# Altium footprint library LimeMicroAltiumLib_pcbLib_r05.PcbLib: 746 footprints (part 17 of 48)
Each footprint in its own frame and in the unit in brackets; x right, y up, seen from the top. Pads: shape width x height; smd on the part's side, far side on the other; paste and mask are expansions set on the pad; w line width, h text height; cw(c..) or ccw(c..) is an arc to the next point about the centre after c.
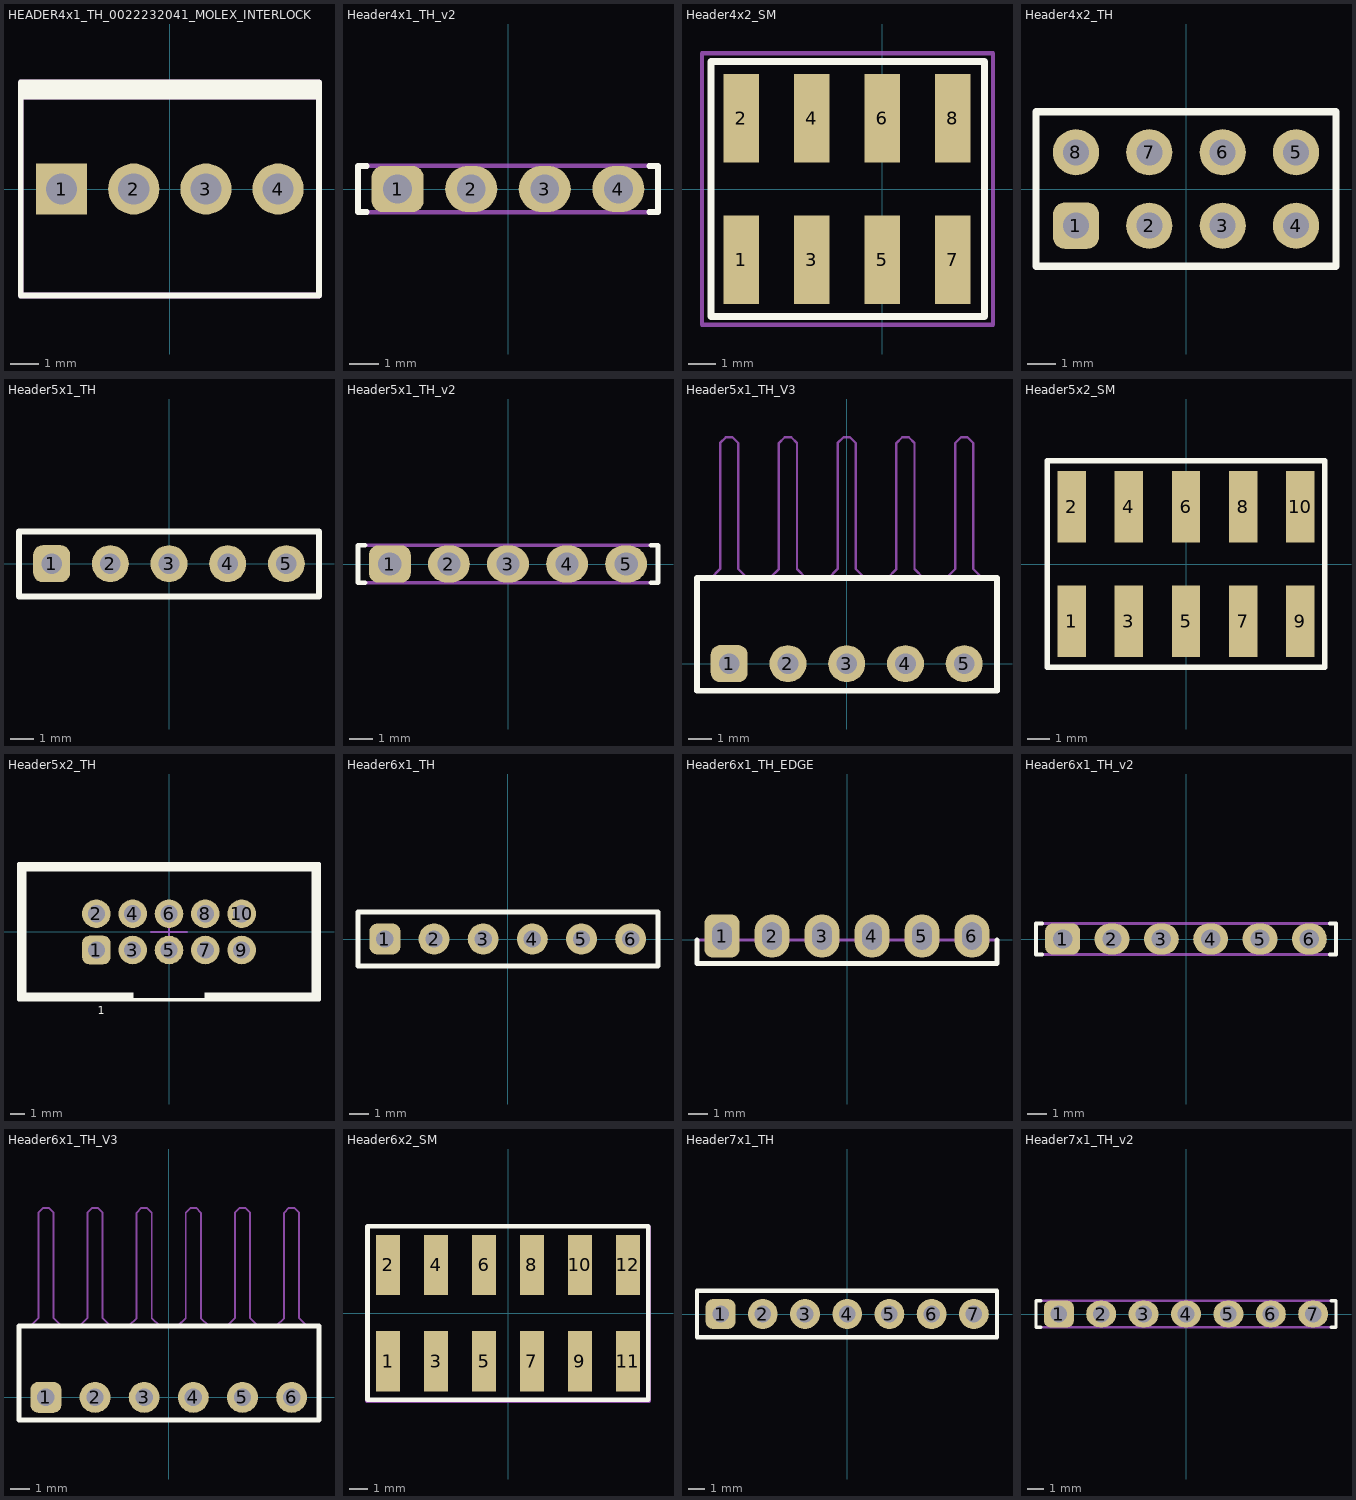
[diagram p16: the footprints below, top view; thin cyan lines are the x and y axes]

## HEADER4x1_TH_0022232041_MOLEX_INTERLOCK [mm]
pads (4):
  rect 1.8x1.8 hole 1.1: 1(-3.81,0)
  round 1.8 hole 1.1: 2(-1.27,0) 3(1.27,0) 4(3.81,0)
Top Overlay:
  region: -5.31,3.25 -5.31,3.75 5.19,3.75 5.19,3.25
  lines w0.2: -5.25,3.25 5.25,3.25 ; -5.25,-3.75 5.25,-3.75 5.25,3.75 -5.25,3.75 -5.25,-3.75
Mechanical 15:
  region: -5.25,3.25 -5.25,3.75 5.25,3.75 5.25,3.25
  lines w0.2: -5.25,3.25 5.19,3.25 ; -5.25,-3.75 5.25,-3.75 5.25,3.75 -5.25,3.75 -5.25,-3.75
  text "Interlock wall" at -3.75,2.25 h0.55
  text ".Designator" at 0,0 h0.55
3D body "022232041.stp": height 10.68, standoff -3.54, extent -5.004,-3.251 5.004,3.099

## Header4x1_TH_v2 [mm]
pads (4):
  rrect50% 1.8x1.6 hole 1: 1(-3.814,0)
  oval 1.8x1.6 hole 1: 2(-1.271,0) 3(1.271,0) 4(3.814,0)
Top Overlay:
  lines w0.2: -4.886,-0.8 -5.186,-0.8 -5.186,0.8 -4.886,0.8 ; 4.886,-0.8 5.186,-0.8 5.186,0.8 4.886,0.8
Mechanical 15:
  lines w0.15: -5.186,-0.8 -5.186,0.8 5.186,0.8 5.186,-0.8 -5.186,-0.8
  text ".Designator" at -0.025,0 h0.55

## Header4x2_SM [mm]
pads (8):
  rect 1.27x3.2 smd: 1(-5.086,-2.55) 2(-5.086,2.55) 3(-2.543,-2.55) 4(-2.543,2.55) 5(0,-2.55) 6(0,2.55) 7(2.543,-2.55) 8(2.543,2.55)
Top Overlay:
  lines w0.254: -6.186,-4.6 3.7,-4.6 3.7,4.6 -6.186,4.6 -6.186,-4.6
Mechanical 15:
  lines w0.15: -6.5,-4.9 4,-4.9 4,4.9 -6.5,4.9 -6.5,-4.9
  text ".Designator" at -1.4,-0.1 h0.55
3D body "pin_header_a-sl254-dg-g08mp1.stp": height 9.7, standoff -0.04, extent -6.38,-3.75 3.78,3.75

## Header4x2_TH [mm]
pads (8):
  rrect50% 1.6x1.6 hole 0.9: 1(-3.814,-1.271)
  round 1.6 hole 0.9: 2(-1.271,-1.271) 3(1.271,-1.271) 4(3.814,-1.271) 5(3.814,1.271) 6(1.271,1.271) 7(-1.271,1.271) 8(-3.814,1.271)
Top Overlay:
  lines w0.254: -5.2,-2.675 -5.2,2.675 5.2,2.675 5.2,-2.675 -5.2,-2.675
Mechanical 15:
  lines w0.15: -5.2,-2.675 5.2,-2.675 5.2,2.675 -5.2,2.675 -5.2,-2.675
  text ".Designator" at 0,0 h0.55
3D body "65775.stp": height 8.54, standoff -3, extent -5.084,-2.541 -2.544,-0.001
3D body "65775.stp": height 8.54, standoff -3, extent -2.541,-2.541 -0.001,-0.001
3D body "65775.stp": height 8.54, standoff -3, extent 0.001,-2.541 2.541,-0.001
3D body "65775.stp": height 8.54, standoff -3, extent 2.544,-2.541 5.084,-0.001
3D body "65775.stp": height 8.54, standoff -3, extent 2.544,0.002 5.084,2.542
3D body "65775.stp": height 8.54, standoff -3, extent 0.001,0.002 2.541,2.542
3D body "65775.stp": height 8.54, standoff -3, extent -2.541,0.002 -0.001,2.542
3D body "65775.stp": height 8.54, standoff -3, extent -5.084,0.002 -2.544,2.542

## Header5x1_TH [mm]
pads (5):
  rrect50% 1.6x1.6 hole 0.9: 1(-5.086,0)
  round 1.6 hole 0.9: 2(-2.543,0) 3(0,0) 4(2.543,0) 5(5.086,0)
Top Overlay:
  lines w0.254: -6.5,-1.425 -6.5,1.4 6.5,1.4 6.5,-1.425 -6.5,-1.425
Mechanical 15:
  lines w0.15: -6.5,-1.425 6.5,-1.425 6.5,1.4 -6.5,1.4 -6.5,-1.425
  text ".Designator" at 0,0 h0.55
3D body "65775.stp": height 8.54, standoff -3, extent -6.356,-1.27 -3.816,1.27
3D body "65775.stp": height 8.54, standoff -3, extent -3.813,-1.27 -1.273,1.27
3D body "65775.stp": height 8.54, standoff -3, extent -1.27,-1.27 1.27,1.27
3D body "65775.stp": height 8.54, standoff -3, extent 1.273,-1.27 3.813,1.27
3D body "65775.stp": height 8.54, standoff -3, extent 3.816,-1.27 6.356,1.27

## Header5x1_TH_v2 [mm]
pads (5):
  rrect50% 1.8x1.6 hole 1: 1(-5.086,0)
  oval 1.8x1.6 hole 1: 2(-2.543,0) 3(0,0) 4(2.543,0) 5(5.086,0)
Top Overlay:
  lines w0.2: -6.157,-0.8 -6.457,-0.8 -6.457,0.8 -6.157,0.8 ; 6.157,-0.8 6.457,-0.8 6.457,0.8 6.157,0.8
Mechanical 15:
  lines w0.15: -6.457,-0.8 6.457,-0.8 6.457,0.8 -6.457,0.8 -6.457,-0.8
  text ".Designator" at 0,0 h0.55

## Header5x1_TH_V3 [mm]
pads (5):
  rrect50% 1.6x1.6 hole 0.9: 1(-5.086,0)
  round 1.6 hole 0.9: 2(-2.543,0) 3(0,0) 4(2.543,0) 5(5.086,0)
Top Overlay:
  lines w0.254: -6.479,-1.175 -6.479,3.7 6.504,3.7 6.504,-1.175 -6.479,-1.175
Mechanical 15:
  lines w0.1: -5.879,3.7 -5.479,4.1 -5.479,9.55 -5.229,9.8 -4.943,9.8 -4.693,9.55 -4.693,4.1 -4.293,3.7 ; -3.336,3.7 -2.936,4.1 -2.936,9.55 -2.686,9.8 -2.4,9.8 -2.15,9.55 -2.15,4.1 -1.75,3.7 ; -0.793,3.7 -0.393,4.1 -0.393,9.55 -0.143,9.8 0.143,9.8 0.393,9.55 0.393,4.1 0.793,3.7 ; 1.75,3.7 2.15,4.1 2.15,9.55 2.4,9.8 2.686,9.8 2.936,9.55 2.936,4.1 3.336,3.7 ; 4.293,3.7 4.693,4.1 4.693,9.55 4.943,9.8 5.229,9.8 5.479,9.55 5.479,4.1 5.879,3.7
  lines w0.15: -6.479,-1.175 6.504,-1.175 6.504,3.7 -6.479,3.7 -6.479,-1.175
  text ".Designator" at 0,0 h0.55
3D body "User Library-Header_Male_RA_Low_1Pin.STEP": height 2.51, standoff -3, extent -6.356,-0.32 -3.816,9.81
3D body "User Library-Header_Male_RA_Low_1Pin.STEP": height 2.51, standoff -3, extent -3.813,-0.32 -1.273,9.81
3D body "User Library-Header_Male_RA_Low_1Pin.STEP": height 2.51, standoff -3, extent -1.27,-0.32 1.27,9.81
3D body "User Library-Header_Male_RA_Low_1Pin.STEP": height 2.51, standoff -3, extent 1.273,-0.32 3.813,9.81
3D body "User Library-Header_Male_RA_Low_1Pin.STEP": height 2.51, standoff -3, extent 3.816,-0.32 6.356,9.81

## Header5x2_SM [mm]
pads (10):
  rect 1.27x3.2 smd: 1(-5.086,-2.55) 2(-5.086,2.55) 3(-2.543,-2.55) 4(-2.543,2.55) 5(0,-2.55) 6(0,2.55) 7(2.543,-2.55) 8(2.543,2.55) 9(5.086,-2.55) 10(5.086,2.55)
Top Overlay:
  lines w0.254: -6.186,-4.6 6.189,-4.6 6.189,4.6 -6.186,4.6 -6.186,-4.6
Mechanical 15:
  lines w0.15: -6.2,-4.6 -6.2,4.6 6.2,4.6 6.2,-4.6 -6.2,-4.6
  text ".Designator" at 0,0 h0.55
3D body "pin_header_a-sl254-dg-g10mp1.stp": height 9.7, standoff -0.04, extent -6.35,-3.75 6.35,3.75

## Header5x2_TH [mm]
pads (10):
  rrect50% 2x2 hole 1.2: 1(-5.086,-1.271)
  round 2 hole 1.2: 2(-5.086,1.271) 3(-2.543,-1.271) 4(-2.543,1.271) 5(0,-1.271) 6(0,1.271) 7(2.543,-1.271) 8(2.543,1.271) 9(5.086,-1.271) 10(5.086,1.271)
Top Overlay:
  region: -10.5,-4.75 -10.5,4.75 -10,4.75 -10,-4.75
  region: -10.25,-4.25 -2.5,-4.25 -2.5,-4.75 -10.25,-4.75
  region: 10.25,-4.25 2.5,-4.25 2.5,-4.75 10.25,-4.75
  region: 10.5,-4.75 10.5,4.75 10,4.75 10,-4.75
  region: 10.5,4.25 -10.5,4.25 -10.5,4.75 10.5,4.75
  lines w0.254: -10.5,-4.75 10.5,-4.75 10.5,4.75 -10.5,4.75 -10.5,-4.75
  text "1" at -5,-5.75 h0.55
Mechanical 15:
  lines w0.15: -1.25,0 0,0 ; 0,-1.25 0,0 ; 0,1.25 0,0 ; 1.25,0 0,0 ; -10.5,-4.75 -10.5,4.75 10.5,4.75 10.5,-4.75 -10.5,-4.75
  text ".Designator" at 0,0 h0.55
  text "1" at -5.25,-1.5 h0.55
3D body "702461001.stp": height 9.55, standoff -3.14, extent -10.181,-4.445 10.139,4.445

## Header6x1_TH [mm]
pads (6):
  rrect50% 1.6x1.6 hole 0.9: 1(-6.357,0)
  round 1.6 hole 0.9: 2(-3.814,0) 3(-1.271,0) 4(1.271,0) 5(3.814,0) 6(6.357,0)
Top Overlay:
  lines w0.254: -7.75,-1.4 -7.75,1.4 7.775,1.4 7.775,-1.4 -7.75,-1.4
Mechanical 15:
  lines w0.15: -7.75,-1.4 7.775,-1.4 7.775,1.4 -7.75,1.4 -7.75,-1.4
  text ".Designator" at -1.271,0 h0.55
3D body "65775.stp": height 8.54, standoff -3, extent -7.627,-1.27 -5.087,1.27
3D body "65775.stp": height 8.54, standoff -3, extent -5.084,-1.27 -2.544,1.27
3D body "65775.stp": height 8.54, standoff -3, extent -2.541,-1.27 -0.001,1.27
3D body "65775.stp": height 8.54, standoff -3, extent 0.001,-1.27 2.541,1.27
3D body "65775.stp": height 8.54, standoff -3, extent 2.544,-1.27 5.084,1.27
3D body "65775.stp": height 8.54, standoff -3, extent 5.087,-1.27 7.627,1.27

## Header6x1_TH_EDGE [mm]
pads (6):
  rrect50% 1.8x2.2 hole 1 slot 1.4 at 90 deg: 1(-6.357,0.2)
  oval 1.8x2.2 hole 1 slot 1.4 at 90 deg: 2(-3.814,0.2) 3(-1.271,0.2) 4(1.271,0.2) 5(3.814,0.2) 6(6.357,0.2)
Top Overlay:
  lines w0.254: -7.629,0 -7.629,-1.2 7.629,-1.2 7.629,0
Mechanical 15:
  lines w0.15: -7.629,-1.2 -7.629,0 7.629,0 7.629,-1.2 -7.629,-1.2
  text ".Designator" at 0,0 h0.55

## Header6x1_TH_v2 [mm]
pads (6):
  rrect50% 1.8x1.6 hole 1: 1(-6.357,0)
  oval 1.8x1.6 hole 1: 2(-3.814,0) 3(-1.271,0) 4(1.271,0) 5(3.814,0) 6(6.357,0)
Top Overlay:
  lines w0.2: -7.429,-0.8 -7.729,-0.8 -7.729,0.8 -7.429,0.8 ; 7.429,-0.8 7.729,-0.8 7.729,0.8 7.429,0.8
Mechanical 15:
  lines w0.15: -7.729,-0.8 -7.729,0.8 7.729,0.8 7.729,-0.8 -7.729,-0.8
  text ".Designator" at 0,0 h0.55

## Header6x1_TH_V3 [mm]
pads (6):
  rrect50% 1.6x1.6 hole 0.9: 1(-6.357,0)
  round 1.6 hole 0.9: 2(-3.814,0) 3(-1.271,0) 4(1.271,0) 5(3.814,0) 6(6.357,0)
Top Overlay:
  lines w0.254: -7.75,-1.175 7.775,-1.175 7.775,3.7 -7.75,3.7 -7.75,-1.175
Mechanical 15:
  lines w0.1: -7.15,3.7 -6.75,4.1 -6.75,9.55 -6.5,9.8 -6.214,9.8 -5.964,9.55 -5.964,4.1 -5.564,3.7 ; -4.607,3.7 -4.207,4.1 -4.207,9.55 -3.957,9.8 -3.671,9.8 -3.421,9.55 -3.421,4.1 -3.021,3.7 ; -2.064,3.7 -1.664,4.1 -1.664,9.55 -1.414,9.8 -1.129,9.8 -0.879,9.55 -0.879,4.1 -0.479,3.7 ; 0.479,3.7 0.879,4.1 0.879,9.55 1.129,9.8 1.414,9.8 1.664,9.55 1.664,4.1 2.064,3.7 ; 3.021,3.7 3.421,4.1 3.421,9.55 3.671,9.8 3.957,9.8 4.207,9.55 4.207,4.1 4.607,3.7 ; 5.564,3.7 5.964,4.1 5.964,9.55 6.214,9.8 6.5,9.8 6.75,9.55 6.75,4.1 7.15,3.7
  lines w0.15: -7.75,-1.175 -7.75,3.7 7.775,3.7 7.775,-1.175 -7.75,-1.175
  text ".Designator" at -1.271,0 h0.55
3D body "User Library-Header_Male_RA_Low_1Pin.STEP": height 3.78, standoff -1.73, extent 5.087,-0.32 7.627,9.81
3D body "User Library-Header_Male_RA_Low_1Pin.STEP": height 3.78, standoff -1.73, extent 2.544,-0.32 5.084,9.81
3D body "User Library-Header_Male_RA_Low_1Pin.STEP": height 3.78, standoff -1.73, extent 0.002,-0.32 2.542,9.81
3D body "User Library-Header_Male_RA_Low_1Pin.STEP": height 3.78, standoff -1.73, extent -2.541,-0.32 -0.001,9.81
3D body "User Library-Header_Male_RA_Low_1Pin.STEP": height 3.78, standoff -1.73, extent -5.084,-0.32 -2.544,9.81
3D body "User Library-Header_Male_RA_Low_1Pin.STEP": height 3.78, standoff -1.73, extent -7.627,-0.32 -5.087,9.81

## Header6x2_SM [mm]
pads (12):
  rect 1.27x3.2 smd: 1(-6.357,-2.55) 2(-6.357,2.55) 3(-3.814,-2.55) 4(-3.814,2.55) 5(-1.271,-2.55) 6(-1.271,2.55) 7(1.271,-2.55) 8(1.271,2.55) 9(3.814,-2.55) 10(3.814,2.55) 11(6.357,-2.55) 12(6.357,2.55)
Top Overlay:
  lines w0.254: -7.457,-4.6 7.443,-4.6 7.443,4.6 -7.457,4.6 -7.457,-4.6
Mechanical 15:
  lines w0.15: -7.5,-4.7 -7.5,4.6 7.5,4.6 7.5,-4.7 -7.5,-4.7
  text ".Designator" at 0,0 h0.55
3D body "pin_header_a-sl254-dg-g12mp1.stp": height 9.7, standoff -0.04, extent -7.62,-3.75 7.62,3.75

## Header7x1_TH [mm]
pads (7):
  rrect50% 1.8x1.8 hole 1: 1(-7.629,0)
  round 1.8 hole 1: 2(-5.086,0) 3(-2.543,0) 4(0,0) 5(2.543,0) 6(5.086,0) 7(7.629,0)
Top Overlay:
  lines w0.254: -9.05,-1.4 9.025,-1.4 9.025,1.4 -9.05,1.4 -9.05,-1.4
Mechanical 15:
  lines w0.15: -9.05,-1.4 -9.05,1.4 9.025,1.4 9.025,-1.4 -9.05,-1.4
  text ".Designator" at 0,0 h0.55
3D body "65775.stp": height 8.54, standoff -3, extent -8.899,-1.27 -6.359,1.27
3D body "65775.stp": height 8.54, standoff -3, extent -6.356,-1.27 -3.816,1.27
3D body "65775.stp": height 8.54, standoff -3, extent -3.813,-1.27 -1.273,1.27
3D body "65775.stp": height 8.54, standoff -3, extent -1.27,-1.27 1.27,1.27
3D body "65775.stp": height 8.54, standoff -3, extent 1.273,-1.27 3.813,1.27
3D body "65775.stp": height 8.54, standoff -3, extent 3.816,-1.27 6.356,1.27
3D body "65775.stp": height 8.54, standoff -3, extent 6.359,-1.27 8.899,1.27

## Header7x1_TH_v2 [mm]
pads (7):
  rrect50% 1.8x1.6 hole 1: 1(-7.629,0)
  oval 1.8x1.6 hole 1: 2(-5.086,0) 3(-2.543,0) 4(0,0) 5(2.543,0) 6(5.086,0) 7(7.629,0)
Top Overlay:
  lines w0.2: -8.7,-0.8 -9,-0.8 -9,0.8 -8.7,0.8 ; 8.7,-0.8 9,-0.8 9,0.8 8.7,0.8
Mechanical 15:
  lines w0.15: -9,-0.8 -9,0.8 9,0.8 9,-0.8 -9,-0.8
  text ".Designator" at 0,0 h0.55